# Altium integrated library vh_altium_library.intLib: 963 symbols (part 4 of 5) (continued)
## REF198-TSSOP (continued)
REFERENCE DIODE 4.096 VOLT; Manufacturer: Analog Devices Inc; Manufacturer Part Number: REF192GRUZ; Tolerance: ±10mV; Number of Channels: 1; Voltage - Output: 2.5V; Voltage - Input: 3 ~ 15 V; Current - Output: 30mA; Current - Quiescent: 45µA; Description: IC VOLT REF MCRPWR 2.5V 8-TSSOP; Temperature Coefficient: 25ppm/°C; Reference Type: Series; Category: Integrated Circuits (ICs); Current - Cathode: -; Package / Case: 8-TSSOP; Operating Temperature: -40°C ~ 85°C; Supplier: Digi-Key; Packaging: Tube; RoHS: RoHS Compliant; Supplier 1: Digi-Key; Supplier Part Number: REF192GRUZ-ND; Supplier Part Number 1: REF192GRUZ-ND
footprint TSSOP8
pins: 2 VCC, 3 SLEEP, 4 GND, 6 OUT


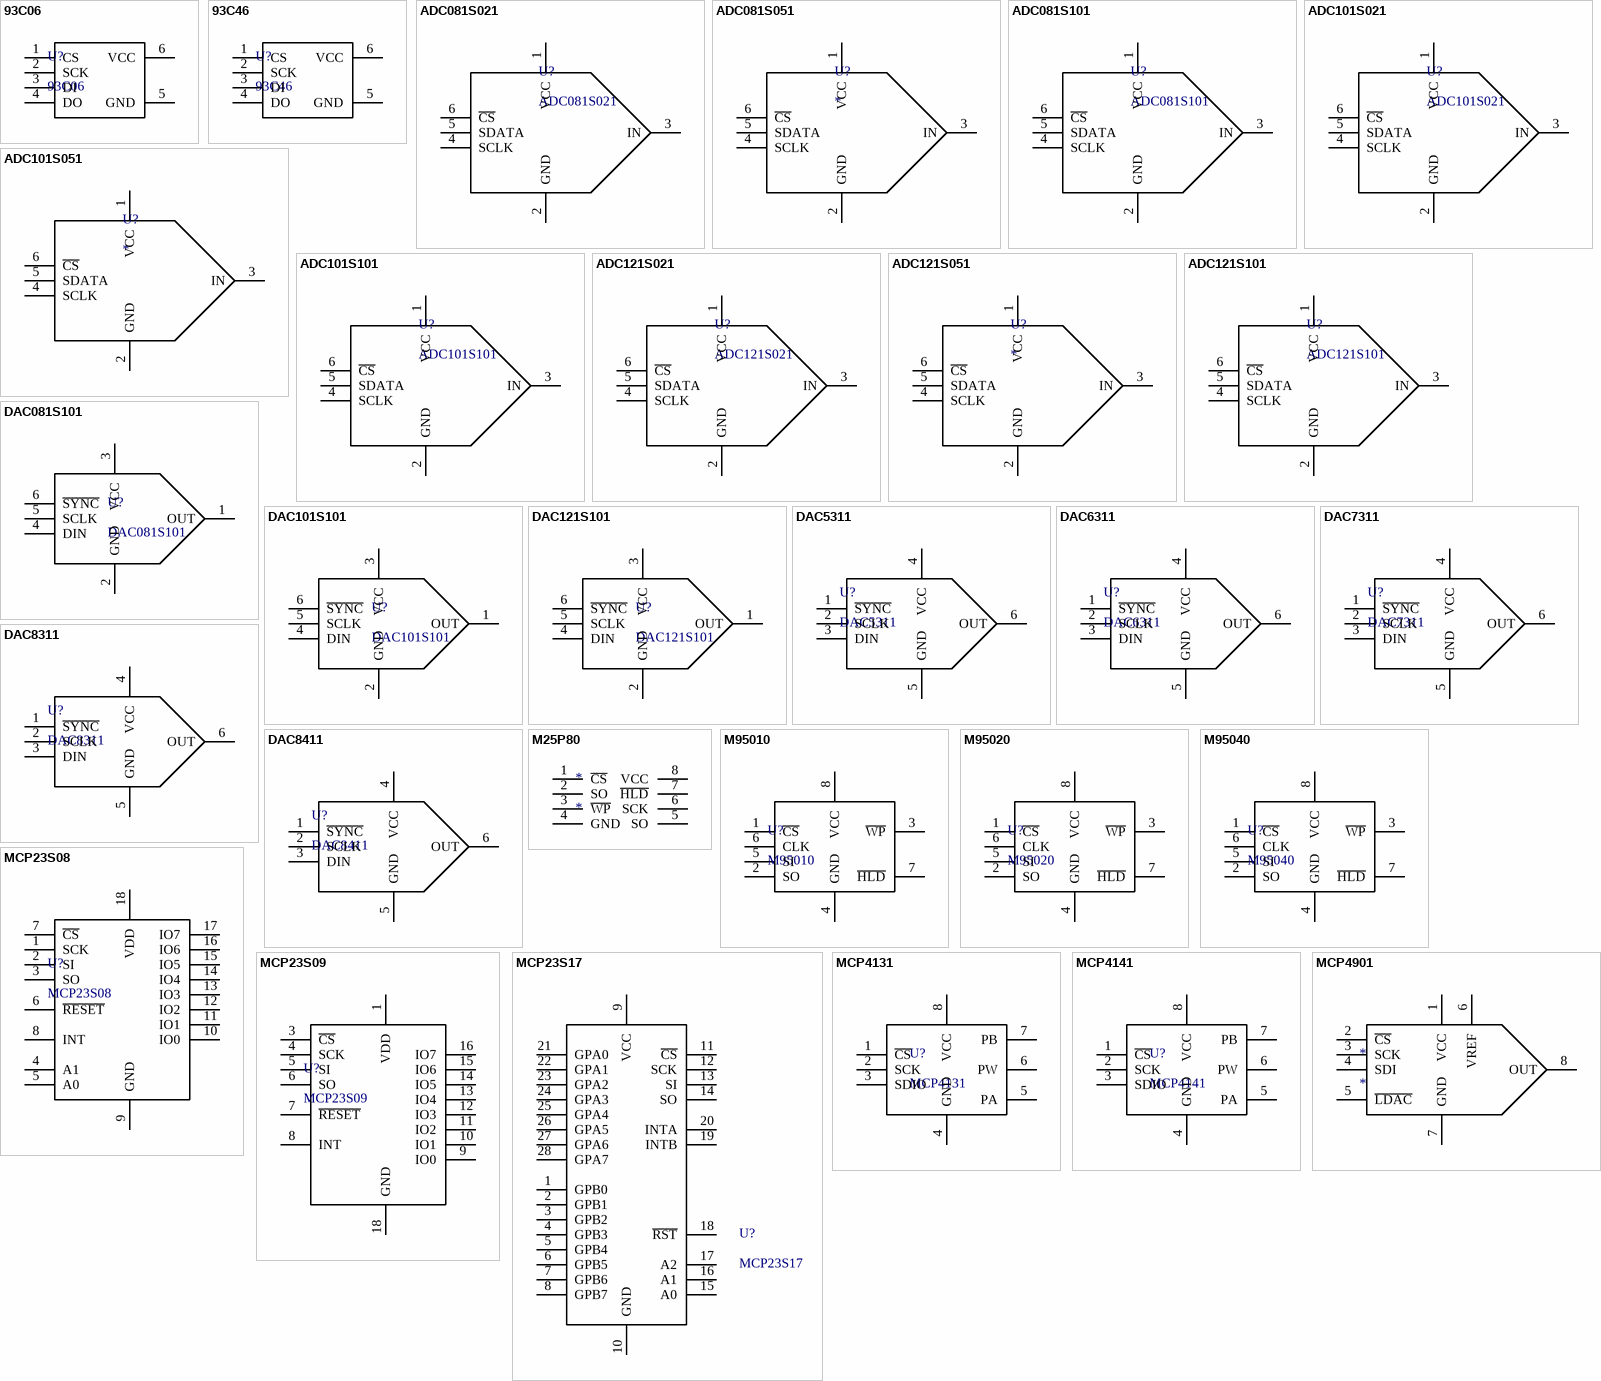
[diagram p45: symbols 93C06 to MCP4901]

## 93C06
designator U?
Supplier 1: Mouser; Supplier Part Number 1: 512-FM93C06M8
footprint SO8
pins: 1 CS, 2 SCK, 3 DI, 4 DO, 5 GND, 6 VCC

## 93C46
designator U?
Supplier 1: Mouser; Supplier Part Number 1: 579-93C46B/SN
footprint SO8
pins: 1 CS, 2 SCK, 3 DI, 4 DO, 5 GND, 6 VCC

## ADC081S021
designator U?
Supplier 1: Digi-Key; Supplier Part Number 1: ADC121S021CIMFTR-ND
footprint SOT23-6
pins: 1 VCC, 2 GND, 3 IN, 4 SCLK, 5 SDATA, 6 ~{CS}

## ADC081S051
designator U?
ADC081S051; Supplier 1: Digi-Key; Supplier Part Number 1: ADC121S051CIMFCT-ND
footprint SOT23-6
pins: 1 VCC, 2 GND, 3 IN, 4 SCLK, 5 SDATA, 6 ~{CS}

## ADC081S101
designator U?
Supplier 1: Digi-Key; Supplier Part Number 1: ADC121S101CIMFTR-ND
footprint SOT23-6
pins: 1 VCC, 2 GND, 3 IN, 4 SCLK, 5 SDATA, 6 ~{CS}

## ADC101S021
designator U?
Supplier 1: Digi-Key; Supplier Part Number 1: ADC101S021CIMFTR-ND
footprint SOT23-6
pins: 1 VCC, 2 GND, 3 IN, 4 SCLK, 5 SDATA, 6 ~{CS}

## ADC101S051
designator U?
ADC101S051; Supplier 1: Digi-Key; Supplier Part Number 1: ADC101S051CIMFTR-ND
footprint SOT23-6
pins: 1 VCC, 2 GND, 3 IN, 4 SCLK, 5 SDATA, 6 ~{CS}

## ADC101S101
designator U?
Supplier 1: Digi-Key; Supplier Part Number 1: ADC101S101CIMFTR-ND
footprint SOT23-6
pins: 1 VCC, 2 GND, 3 IN, 4 SCLK, 5 SDATA, 6 ~{CS}

## ADC121S021
designator U?
Supplier 1: Digi-Key; Supplier Part Number 1: ADC121S021CIMFTR-ND
footprint SOT23-6
pins: 1 VCC, 2 GND, 3 IN, 4 SCLK, 5 SDATA, 6 ~{CS}

## ADC121S051
designator U?
ADC121S051; Supplier 1: Digi-Key; Supplier Part Number 1: ADC121S051CIMFCT-ND
footprint SOT23-6
pins: 1 VCC, 2 GND, 3 IN, 4 SCLK, 5 SDATA, 6 ~{CS}

## ADC121S101
designator U?
Supplier 1: Digi-Key; Supplier Part Number 1: ADC121S101CIMFTR-ND
footprint SOT23-6
pins: 1 VCC, 2 GND, 3 IN, 4 SCLK, 5 SDATA, 6 ~{CS}

## DAC081S101
designator U?
Supplier 1: Digi-Key; Supplier Part Number 1: DAC081S101CIMKTR-ND
footprint SOT23-6
pins: 1 OUT, 2 GND, 3 VCC, 4 DIN, 5 SCLK, 6 ~{SYNC}

## DAC101S101
designator U?
Supplier 1: Digi-Key; Supplier Part Number 1: DAC101S101CIMKTR-ND
footprint SOT23-6
pins: 1 OUT, 2 GND, 3 VCC, 4 DIN, 5 SCLK, 6 ~{SYNC}

## DAC121S101
designator U?
Supplier 1: Digi-Key; Supplier Part Number 1: DAC121S101CIMKTR-ND
footprint SOT23-6
pins: 1 OUT, 2 GND, 3 VCC, 4 DIN, 5 SCLK, 6 ~{SYNC}

## DAC5311
designator U?
Supplier 1: Digi-Key; Supplier Part Number 1: 296-24180-2-ND
footprint SOT23-6
pins: 1 ~{SYNC}, 2 SCLK, 3 DIN, 4 VCC, 5 GND, 6 OUT

## DAC6311
designator U?
Supplier 1: Digi-Key; Supplier Part Number 1: 296-23716-2-ND
footprint SOT23-6
pins: 1 ~{SYNC}, 2 SCLK, 3 DIN, 4 VCC, 5 GND, 6 OUT

## DAC7311
designator U?
Supplier 1: Digi-Key; Supplier Part Number 1: 296-26043-1-ND
footprint SOT23-6
pins: 1 ~{SYNC}, 2 SCLK, 3 DIN, 4 VCC, 5 GND, 6 OUT

## DAC8311
designator U?
Supplier 1: Digi-Key; Supplier Part Number 1: 296-23760-2-ND
footprint SOT23-6
pins: 1 ~{SYNC}, 2 SCLK, 3 DIN, 4 VCC, 5 GND, 6 OUT

## DAC8411
designator U?
Supplier 1: Digi-Key; Supplier Part Number 1: DAC8411IDCKR-ND
footprint SOT23-6
pins: 1 ~{SYNC}, 2 SCLK, 3 DIN, 4 VCC, 5 GND, 6 OUT

## M25P80
designator *
footprint SO8
pins: 1 ~{CS}, 2 SO, 3 ~{WP}, 4 GND, 5 SO, 6 SCK, 7 ~{HLD}, 8 VCC

## M95010
designator U?
Supplier 1: Mouser; Supplier Part Number 1: 511-M95010-RMN6P
footprint SO8
pins: 1 ~{CS}, 2 SO, 3 ~{WP}, 4 GND, 5 SI, 6 CLK, 7 ~{HLD}, 8 VCC

## M95020
designator U?
Supplier 1: Mouser; Supplier Part Number 1: 511-M95020-RDW6TP
footprint SO8
pins: 1 ~{CS}, 2 SO, 3 ~{WP}, 4 GND, 5 SI, 6 CLK, 7 ~{HLD}, 8 VCC

## M95040
designator U?
Supplier 1: Digi-Key; Supplier Part Number 1: 497-8677-2-ND
footprint SO8
pins: 1 ~{CS}, 2 SO, 3 ~{WP}, 4 GND, 5 SI, 6 CLK, 7 ~{HLD}, 8 VCC

## MCP23S08
designator U?
Supplier 1: Digi-Key; Supplier Part Number 1: MCP23S08-E/SO-ND
footprint SO18W
pins: 1 SCK, 2 SI, 3 SO, 4 A1, 5 A0, 6 ~{RESET}, 7 ~{CS}, 8 INT, 9 GND, 10 IO0, 11 IO1, 12 IO2, 13 IO3, 14 IO4, 15 IO5, 16 IO6, 17 IO7, 18 VDD

## MCP23S09
designator U?
Supplier 1: Digi-Key; Supplier Part Number 1: MCP23S09-E/SO-ND
footprint SO18W
pins: 1 VDD, 3 ~{CS}, 4 SCK, 5 SI, 6 SO, 7 ~{RESET}, 8 INT, 9 IO0, 10 IO1, 11 IO2, 12 IO3, 13 IO4, 14 IO5, 15 IO6, 16 IO7, 18 GND

## MCP23S17
designator U?
Supplier 1: Digi-Key; Supplier Part Number 1: MCP23S17-E/SO-ND
footprint SO28W (Footprint not found)
pins: 1 GPB0, 2 GPB1, 3 GPB2, 4 GPB3, 5 GPB4, 6 GPB5, 7 GPB6, 8 GPB7, 9 VCC, 10 GND, 11 ~{CS}, 12 SCK, 13 SI, 14 SO, 15 A0, 16 A1, 17 A2, 18 ~{RST}, 19 INTB, 20 INTA, 21 GPA0, 22 GPA1, 23 GPA2, 24 GPA3, 25 GPA4, 26 GPA5, 27 GPA6, 28 GPA7

## MCP4131
designator U?
Supplier 1: Digi-Key; Supplier Part Number 1: MCP4131-103E/SN-ND
footprint SO8
pins: 1 ~{CS}, 2 SCK, 3 SDIO, 4 GND, 5 PA, 6 PW, 7 PB, 8 VCC

## MCP4141
designator U?
Supplier 1: Digi-Key; Supplier Part Number 1: MCP4141-103E/SN-ND
footprint SO8
pins: 1 ~{CS}, 2 SCK, 3 SDIO, 4 GND, 5 PA, 6 PW, 7 PB, 8 VCC

## MCP4901
designator *
footprint SO8
pins: 1 VCC, 2 ~{CS}, 3 SCK, 4 SDI, 5 ~{LDAC}, 6 VREF, 7 GND, 8 OUT

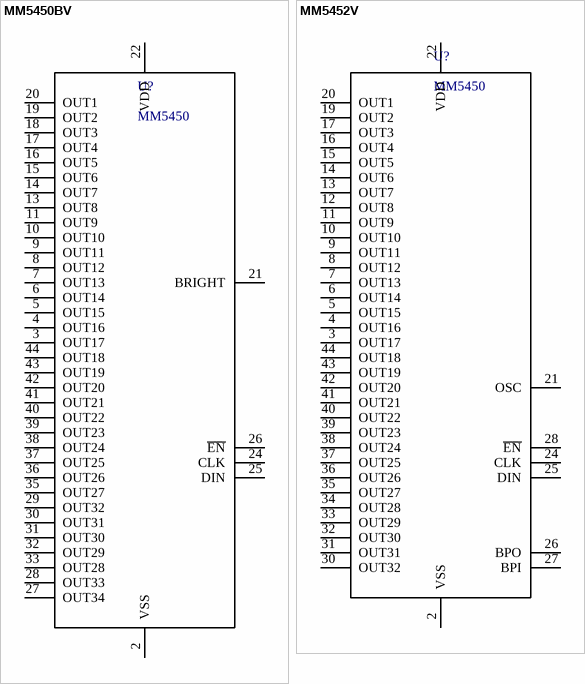
[diagram p46: symbols MM5450BV to MM5452V]

## MM5450BV
designator U?, comment MM5450
Supplier 1: Digi-Key; Supplier Part Number 1: 576-1342-1-ND
footprint PLCC44 (Footprint not found)
pins: 2 VSS, 3 OUT17, 4 OUT16, 5 OUT15, 6 OUT14, 7 OUT13, 8 OUT12, 9 OUT11, 10 OUT10, 11 OUT9, 13 OUT8, 14 OUT7, 15 OUT6, 16 OUT5, 17 OUT4, 18 OUT3, 19 OUT2, 20 OUT1, 21 BRIGHT, 22 VDD, 24 CLK, 25 DIN, 26 ~{EN}, 27 OUT34, 28 OUT33, 29 OUT32, 30 OUT31, 31 OUT30, 32 OUT29, 33 OUT28, 35 OUT27, 36 OUT26, 37 OUT25, 38 OUT24, 39 OUT23, 40 OUT22, 41 OUT21, 42 OUT20, 43 OUT19, 44 OUT18

## MM5452V
designator U?, comment MM5450
Supplier 1: Digi-Key; Supplier Part Number 1: MM5452V-ND
footprint PLCC44 (Footprint not found)
pins: 2 VSS, 3 OUT17, 4 OUT16, 5 OUT15, 6 OUT14, 7 OUT13, 8 OUT12, 9 OUT11, 10 OUT10, 11 OUT9, 12 OUT8, 13 OUT7, 14 OUT6, 15 OUT5, 16 OUT4, 17 OUT3, 19 OUT2, 20 OUT1, 21 OSC, 22 VDD, 24 CLK, 25 DIN, 26 BPO, 27 BPI, 28 ~{EN}, 30 OUT32, 31 OUT31, 32 OUT30, 33 OUT29, 34 OUT28, 35 OUT27, 36 OUT26, 37 OUT25, 38 OUT24, 39 OUT23, 40 OUT22, 41 OUT21, 42 OUT20, 43 OUT19, 44 OUT18


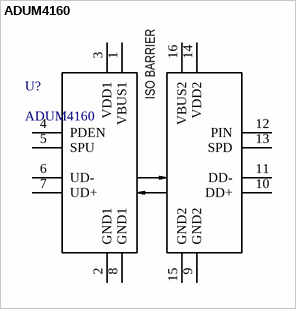
[diagram p47: symbol ADUM4160]

## ADUM4160
designator U?
USB Isolator; Supplier 1: Digi-Key; Supplier Part Number 1: ADUM4160BRWZ-ND
pins: 1 VBUS1, 2 GND1, 3 VDD1, 4 PDEN, 5 SPU, 6 UD-, 7 UD+, 8 GND1, 9 GND2, 10 DD+, 11 DD-, 12 PIN, 13 SPD, 14 VDD2, 15 GND2, 16 VBUS2
text: ISO BARRIER


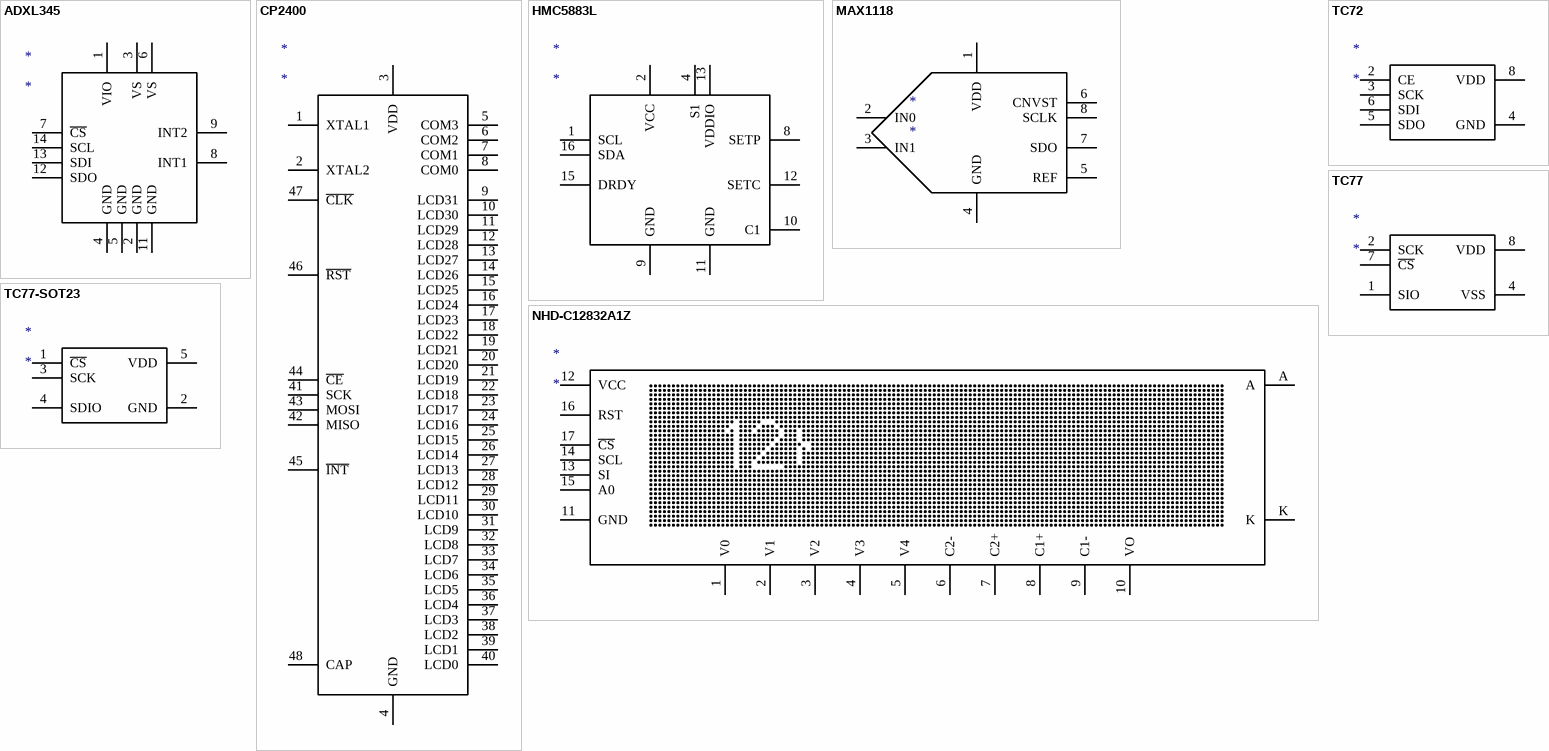
[diagram p48: symbols ADXL345 to TC77-SOT23]

## ADXL345
designator *
pins: 1 VIO, 2 GND, 3 VS, 4 GND, 5 GND, 6 VS, 7 ~{CS}, 8 INT1, 9 INT2, 11 GND, 12 SDO, 13 SDI, 14 SCL

## CP2400
designator *
pins: 1 XTAL1, 2 XTAL2, 3 VDD, 4 GND, 5 COM3, 6 COM2, 7 COM1, 8 COM0, 9 LCD31, 10 LCD30, 11 LCD29, 12 LCD28, 13 LCD27, 14 LCD26, 15 LCD25, 16 LCD24, 17 LCD23, 18 LCD22, 19 LCD21, 20 LCD20, 21 LCD19, 22 LCD18, 23 LCD17, 24 LCD16, 25 LCD15, 26 LCD14, 27 LCD13, 28 LCD12, 29 LCD11, 30 LCD10, 31 LCD9, 32 LCD8, 33 LCD7, 34 LCD6, 35 LCD5, 36 LCD4, 37 LCD3, 38 LCD2, 39 LCD1, 40 LCD0, 41 SCK, 42 MISO, 43 MOSI, 44 ~{CE}, 45 ~{INT}, 46 ~{RST}, 47 ~{CLK}, 48 CAP

## HMC5883L
designator *
pins: 1 SCL, 2 VCC, 4 S1, 8 SETP, 9 GND, 10 C1, 11 GND, 12 SETC, 13 VDDIO, 15 DRDY, 16 SDA

## MAX1118
designator *
pins: 1 VDD, 2 IN0, 3 IN1, 4 GND, 5 REF, 6 CNVST, 7 SDO, 8 SCLK

## NHD-C12832A1Z
designator *
pins: 1 V0, 2 V1, 3 V2, 4 V3, 5 V4, 6 C2-, 7 C2+, 8 C1+, 9 C1-, 10 VO, 11 GND, 12 VCC, 13 SI, 14 SCL, 15 A0, 16 RST, 17 ~{CS}, A, K

## TC72
designator *
pins: 2 CE, 3 SCK, 4 GND, 5 SDO, 6 SDI, 8 VDD

## TC77
designator *
pins: 1 SIO, 2 SCK, 4 VSS, 7 ~{CS}, 8 VDD

## TC77-SOT23
designator *
pins: 1 ~{CS}, 2 GND, 3 SCK, 4 SDIO, 5 VDD


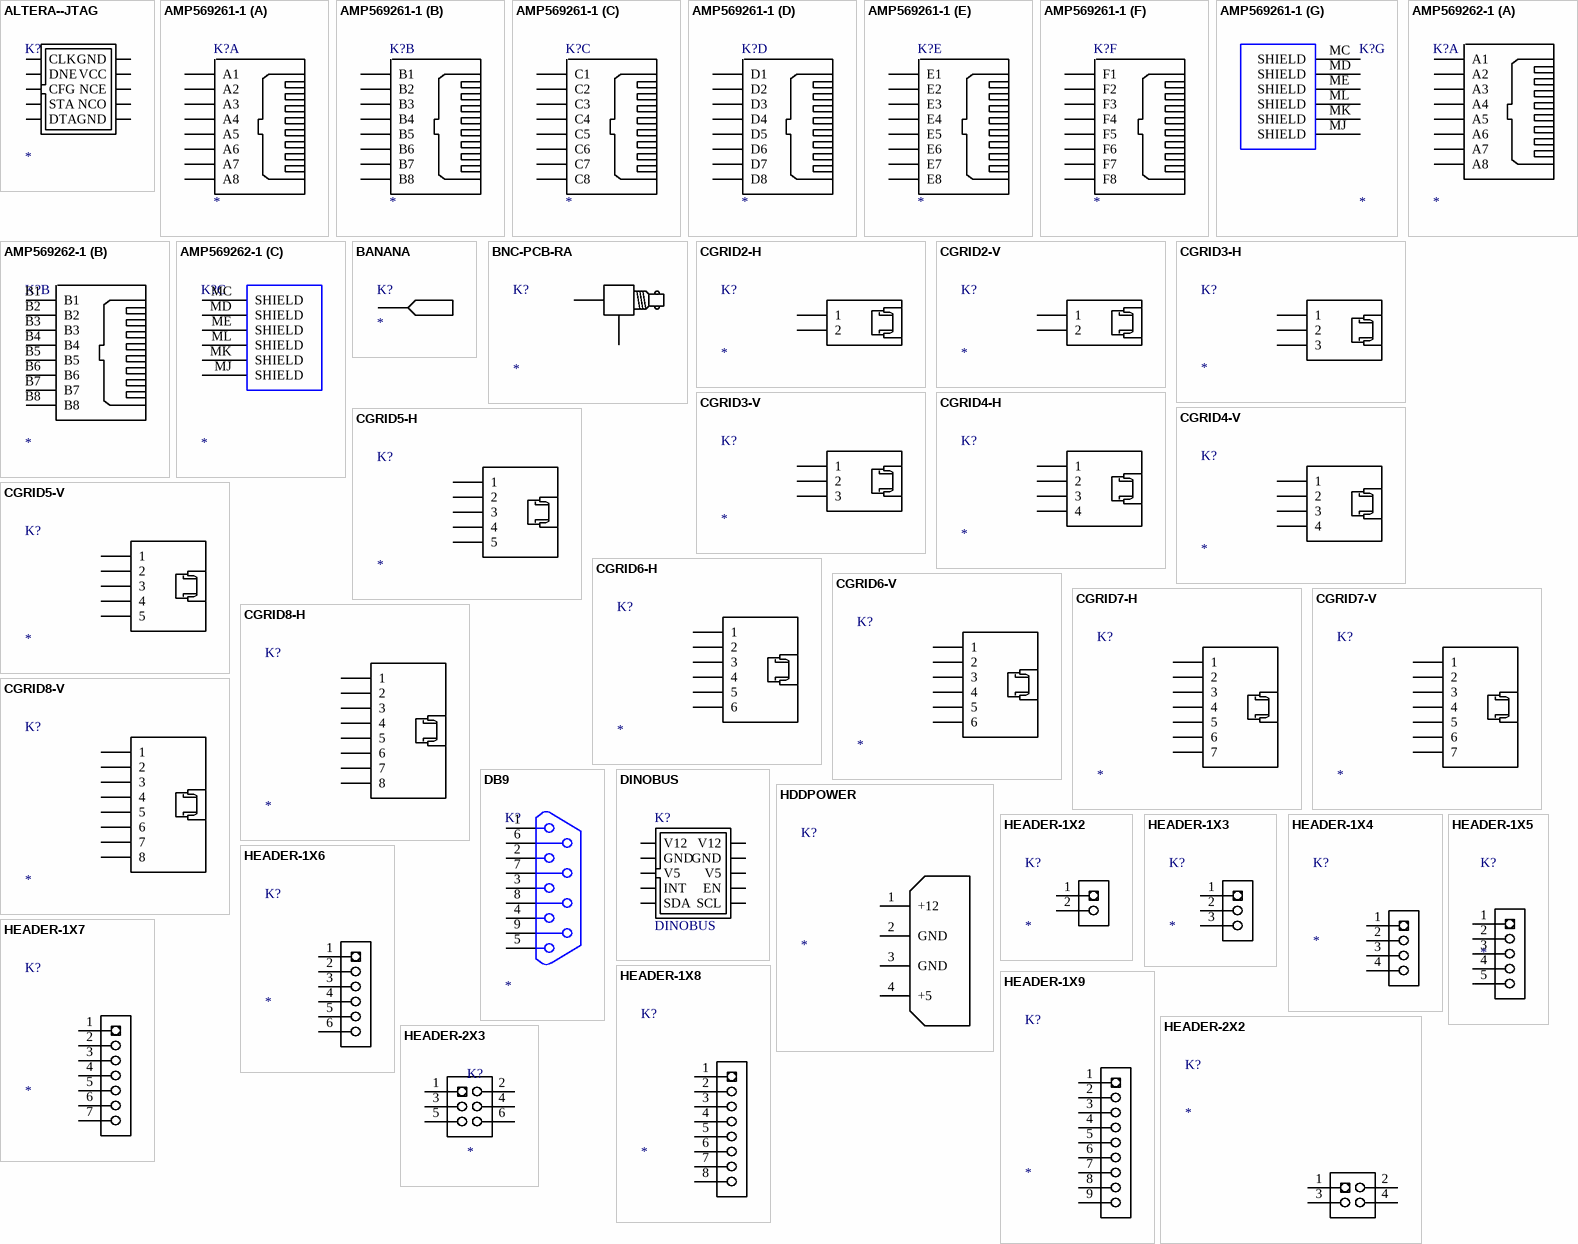
[diagram p49: symbols ALTERA--JTAG to HEADER-2X3]

## ALTERA--JTAG
designator K?
ALTERA 10 PIN JTAG; Manufacturer: Assmann Electronics Inc; Manufacturer Part Number: AWHW10G-0202-T-R; Connector Type: Header, Shrouded; Description: CONN HEADER LOW-PRO 10POS GOLD; Number of Positions: 10; Number of Positions Loaded: All; Pitch: 0.100" (2.54mm); Supplier 1: Digi-Key; Supplier Part Number 1: HRP10H-ND; Supplier: Digi-Key; Contact Type: Male Pin; RoHS: RoHS Compliant; Supplier Part Number: HRP10H-ND; Category: Connectors, Interconnects; Number of Rows: 2; Row Spacing: 0.100" (2.54mm); Contact Mating Length: -; Mounting Type: Through Hole; Termination: Solder; Fastening Type: -; Features: -; Contact Finish: Gold; Contact Finish Thickness: Flash; Color: Gray; Packaging: Tray
footprint IDC10-B
pins: 1 CLK, 2 GND, 3 DNE, 4 VCC, 5 CFG, 6 NCE, 7 STA, 8 NCO, 9 DTA, 10 GND

## AMP569261-1
designator K?
16 X RJ45 SHIELDED STEWART CONNECTOR; Text Field2: SS-73100-047; Text Field3: DIGIKEY; Text Field4: 380-1053-ND; Text Field1: STEWART CONNECTOR; Supplier 1: Digi-Key; Supplier Part Number 1: A31478-ND
footprint AMP569261-1
part A pins: A1, A2, A3, A4, A5, A6, A7, A8
part B pins: B1, B2, B3, B4, B5, B6, B7, B8
part C pins: C1, C2, C3, C4, C5, C6, C7, C8
part D pins: D1, D2, D3, D4, D5, D6, D7, D8
part E pins: E1, E2, E3, E4, E5, E6, E7, E8
part F pins: F1, F2, F3, F4, F5, F6, F7, F8
part G pins: MC SHIELD, MD SHIELD, ME SHIELD, MJ SHIELD, MK SHIELD, ML SHIELD

## AMP569262-1
designator K?
16 X RJ45 SHIELDED STEWART CONNECTOR; Text Field2: SS-73100-047; Text Field3: DIGIKEY; Text Field4: 380-1053-ND; Text Field1: STEWART CONNECTOR
footprint AMP569262-1
part A pins: A1, A2, A3, A4, A5, A6, A7, A8
part B pins: B1, B2, B3, B4, B5, B6, B7, B8
part C pins: MC SHIELD, MD SHIELD, ME SHIELD, MJ SHIELD, MK SHIELD, ML SHIELD

## BANANA
designator K?
BANANA JACK PCB
footprint BANANA
pins: 1, 2

## BNC-PCB-RA
designator K?
BNC CONNECTOR
footprint BNC-RA
pins: 1, 2 gnd, A, B

## CGRID2-H
designator K?
MOLEX GC/WALDOM CGRID CONNECTOR 2 PIN; Supplier 1: Digi-Key; Supplier Part Number 1: WM4900-ND
footprint CGRID-2H
pins: 1, 2

## CGRID2-V
designator K?
MOLEX GC/WALDOM CGRID CONNECTOR 2 PIN; Supplier 1: Digi-Key; Supplier Part Number 1: WM4800-ND
footprint CGRID-2V (Footprint not found)
pins: 1, 2

## CGRID3-H
designator K?
MOLEX GC/WALDOM CGRID CONNECTOR 2 PIN; Supplier 1: Digi-Key; Supplier Part Number 1: WM4901-ND
footprint CGRID-3H (Footprint not found)
pins: 1, 2, 3

## CGRID3-V
designator K?
MOLEX GC/WALDOM CGRID CONNECTOR 2 PIN; Supplier 1: Digi-Key; Supplier Part Number 1: WM4801-ND
footprint CGRID-3V (Footprint not found)
pins: 1, 2, 3

## CGRID4-H
designator K?
MOLEX GC/WALDOM CGRID CONNECTOR 4 PIN; Supplier 1: Digi-Key; Supplier Part Number 1: WM4902-ND
footprint CGRID-4H
pins: 1, 2, 3, 4

## CGRID4-V
designator K?
MOLEX GC/WALDOM CGRID CONNECTOR 4 PIN; Supplier 1: Digi-Key; Supplier Part Number 1: WM4802-ND
footprint CGRID-4V
pins: 1, 2, 3, 4

## CGRID5-H
designator K?
MOLEX GC/WALDOM CGRID CONNECTOR 5 PIN; Supplier 1: Digi-Key; Supplier Part Number 1: WM4903-ND
footprint CGRID-5H
pins: 1, 2, 3, 4, 5

## CGRID5-V
designator K?
MOLEX GC/WALDOM CGRID CONNECTOR 5 PIN; Supplier 1: Digi-Key; Supplier Part Number 1: WM4803-ND
footprint CGRID-5V
pins: 1, 2, 3, 4, 5

## CGRID6-H
designator K?
CONNECTOR 6 PIN HORIZONTAL; Supplier 1: Digi-Key; Supplier Part Number 1: WM4904-ND
footprint CGRID-6H (Footprint not found)
pins: 1, 2, 3, 4, 5, 6

## CGRID6-V
designator K?
CONNECTOR 6 PIN VERTICAL; Supplier 1: Digi-Key; Supplier Part Number 1: WM4804-ND
footprint CGRID-6V (Footprint not found)
pins: 1, 2, 3, 4, 5, 6

## CGRID7-H
designator K?
MOLEX GC/WALDOM CGRID CONNECTOR 7 PIN; Supplier 1: Digi-Key; Supplier Part Number 1: WM4905-ND
footprint CGRID-7H (Footprint not found)
pins: 1, 2, 3, 4, 5, 6, 7

## CGRID7-V
designator K?
MOLEX GC/WALDOM CGRID CONNECTOR 7 PIN; Supplier 1: Digi-Key; Supplier Part Number 1: WM4805-ND
footprint CGRID-7V (Footprint not found)
pins: 1, 2, 3, 4, 5, 6, 7

## CGRID8-H
designator K?
MOLEX GC/WALDOM CGRID CONNECTOR 8 PIN; Supplier 1: Digi-Key; Supplier Part Number 1: WM4906-ND
footprint CGRID-8H (Footprint not found)
pins: 1, 2, 3, 4, 5, 6, 7, 8

## CGRID8-V
designator K?
MOLEX GC/WALDOM CGRID CONNECTOR 8 PIN; Supplier 1: Digi-Key; Supplier Part Number 1: WM4806-ND
footprint CGRID-8V (Footprint not found)
pins: 1, 2, 3, 4, 5, 6, 7, 8

## DB9
designator K?
footprint DB9SLE
pins: 1, 2, 3, 4, 5, 6, 7, 8, 9

## DINOBUS
designator K?
DINOBUS CONNECTOR 10 PIN; Manufacturer: Assmann Electronics Inc; Manufacturer Part Number: AWHW10G-0202-T-R; Connector Type: Header, Shrouded; Description: CONN HEADER LOW-PRO 10POS GOLD; Number of Positions: 10; Number of Positions Loaded: All; Pitch: 0.100" (2.54mm); Supplier 1: Digi-Key; Supplier Part Number 1: HRP10H-ND; Supplier: Digi-Key; Contact Type: Male Pin; RoHS: RoHS Compliant; Supplier Part Number: HRP10H-ND; Category: Connectors, Interconnects; Number of Rows: 2; Row Spacing: 0.100" (2.54mm); Contact Mating Length: -; Mounting Type: Through Hole; Termination: Solder; Fastening Type: -; Features: -; Contact Finish: Gold; Contact Finish Thickness: Flash; Color: Gray; Packaging: Tray
footprint IDC10-B
footprint IDC10-E
pins: 1 V12, 2 V12, 3 GND, 4 GND, 5 V5, 6 V5, 7 INT, 8 EN, 9 SDA, 10 SCL

## HDDPOWER
designator K?
PC power connector; Manufacturer Part Number: 641737-1; Manufacturer: Tyco Electronics; Description: CONN HEADER PIN RT/ANG 4POS TIN; REEL: TH; Supplier 1: Digi-Key; Supplier Part Number 1: A25430-ND
footprint PCPOWER
pins: 1 +12 (power), 2 GND (power), 3 GND (power), 4 +5 (power)

## HEADER-1X2
designator K?
REEL: TH; Supplier 1: Digi-Key; Supplier Part Number 1: S1011E-36-ND
footprint HEADER-1X2
pins: 1, 2
